# Altium footprint library HF_STM32F2_MCU.PcbLib: 59 footprints (part 4 of 6)
Each footprint in its own frame and in the unit in brackets; x right, y up, seen from the top. Pads: shape width x height; smd on the part's side, far side on the other; paste and mask are expansions set on the pad; w line width, h text height; cw(c..) or ccw(c..) is an arc to the next point about the centre after c.
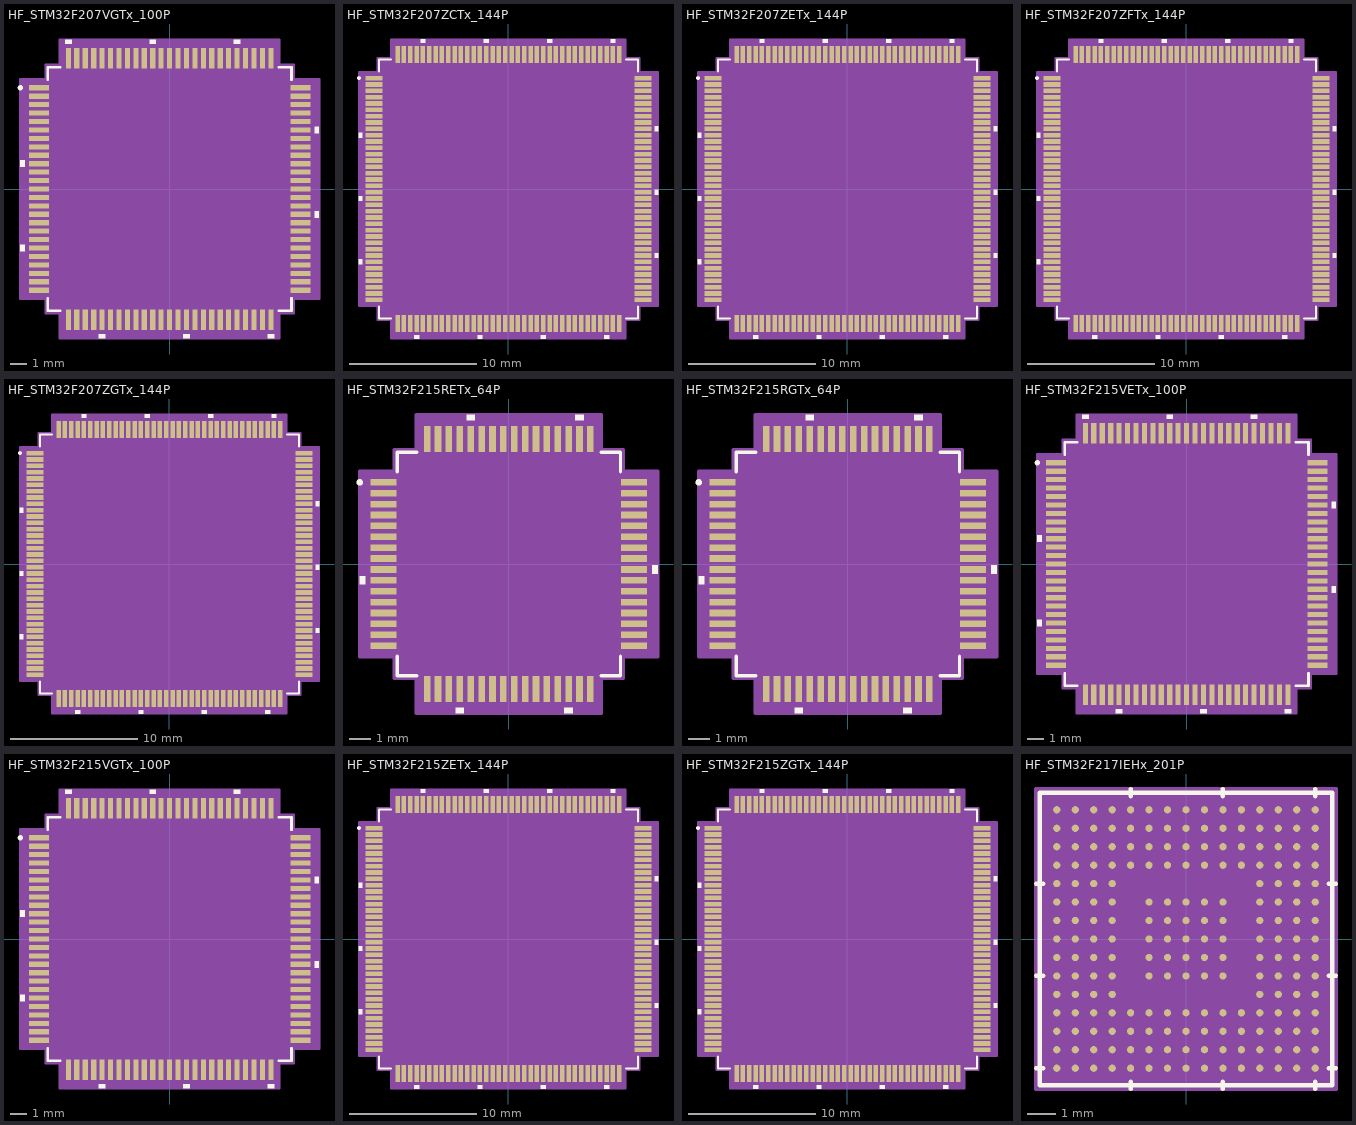
[diagram p3: the footprints below, top view; thin cyan lines are the x and y axes]

## HF_STM32F207VGTx_100P [mil] "LQFP100-14x14mm"
pads (100):
  rect 47x12 smd: 1(-305.12,236.22) 2(-305.12,216.54) 3(-305.12,196.85) 4(-305.12,177.17) 5(-305.12,157.48) 6(-305.12,137.8) 7(-305.12,118.11) 8(-305.12,98.43) 9(-305.12,78.74) 10(-305.12,59.06) 11(-305.12,39.37) 12(-305.12,19.69) 13(-305.12,0) 14(-305.12,-19.68) 15(-305.12,-39.37) 16(-305.12,-59.06) 17(-305.12,-78.74) 18(-305.12,-98.43) 19(-305.12,-118.11) 20(-305.12,-137.8) 21(-305.12,-157.48) 22(-305.12,-177.17) 23(-305.12,-196.85) 24(-305.12,-216.54) 25(-305.12,-236.22) 51(305.12,-236.22) 52(305.12,-216.54) 53(305.12,-196.85) 54(305.12,-177.17) 55(305.12,-157.48) 56(305.12,-137.8) 57(305.12,-118.11) 58(305.12,-98.43) 59(305.12,-78.74) 60(305.12,-59.06) 61(305.12,-39.37) 62(305.12,-19.68) 63(305.12,0) 64(305.12,19.68) 65(305.12,39.37) 66(305.12,59.06) 67(305.12,78.74) 68(305.12,98.43) 69(305.12,118.11) 70(305.12,137.8) 71(305.12,157.48) 72(305.12,177.17) 73(305.12,196.85) 74(305.12,216.54) 75(305.12,236.22)
  rect 12x47 smd: 26(-236.22,-305.12) 27(-216.54,-305.12) 28(-196.85,-305.12) 29(-177.17,-305.12) 30(-157.48,-305.12) 31(-137.8,-305.12) 32(-118.11,-305.12) 33(-98.43,-305.12) 34(-78.74,-305.12) 35(-59.06,-305.12) 36(-39.37,-305.12) 37(-19.68,-305.12) 38(0,-305.12) 39(19.68,-305.12) 40(39.37,-305.12) 41(59.06,-305.12) 42(78.74,-305.12) 43(98.43,-305.12) 44(118.11,-305.12) 45(137.8,-305.12) 46(157.48,-305.12) 47(177.17,-305.12) 48(196.85,-305.12) 49(216.54,-305.12) 50(236.22,-305.12) 76(236.22,305.12) 77(216.54,305.12) 78(196.85,305.12) 79(177.17,305.12) 80(157.48,305.12) 81(137.8,305.12) 82(118.11,305.12) 83(98.43,305.12) 84(78.74,305.12) 85(59.06,305.12) 86(39.37,305.12) 87(19.68,305.12) 88(0,305.12) 89(-19.68,305.12) 90(-39.37,305.12) 91(-59.06,305.12) 92(-78.74,305.12) 93(-98.43,305.12) 94(-118.11,305.12) 95(-137.8,305.12) 96(-157.48,305.12) 97(-177.17,305.12) 98(-196.85,305.12) 99(-216.54,305.12) 100(-236.22,305.12)
Top Overlay:
  circle w6: c-348.46,236.22 r3
  region: -338.62,66.56 -348.62,66.56 -348.62,51.56 -338.62,51.56
  region: -338.62,-130.3 -348.62,-130.3 -348.62,-145.3 -338.62,-145.3
  region: -149.98,-338.62 -164.98,-338.62 -164.98,-348.62 -149.98,-348.62
  region: 46.87,-338.62 31.87,-338.62 31.87,-348.62 46.87,-348.62
  region: 243.72,-338.62 228.72,-338.62 228.72,-348.62 243.72,-348.62
  region: 338.62,-51.56 348.62,-51.56 348.62,-66.56 338.62,-66.56
  region: 338.62,145.3 348.62,145.3 348.62,130.3 338.62,130.3
  region: 164.98,338.62 149.98,338.62 149.98,348.62 164.98,348.62
  region: -31.87,338.62 -46.87,338.62 -46.87,348.62 -31.87,348.62
  region: -228.72,338.62 -243.72,338.62 -243.72,348.62 -228.72,348.62
  lines w6: -284.5,-255.32 -284.5,-284.5 -255.32,-284.5 ; -284.5,255.32 -284.5,284.5 -255.32,284.5 ; 255.32,-284.5 284.5,-284.5 284.5,-255.32 ; 255.32,284.5 284.5,284.5 284.5,255.32
Mechanical 13:
  circle w0: c-256.62,236.22 r3
Mechanical 15:
  region: -256.22,-289.5 -289.5,-289.5 -289.5,-256.22 -348.62,-256.22 -348.62,256.22 -289.5,256.22 -289.5,289.5 -256.22,289.5 -256.22,348.62 256.22,348.62 256.22,289.5 289.5,289.5 289.5,256.22 348.62,256.22 348.62,-256.22 289.5,-256.22 289.5,-289.5 256.22,-289.5 256.22,-348.62 -256.22,-348.62
  lines w6: -348.62,-256.22 -289.5,-256.22 -289.5,-289.5 -256.22,-289.5 -256.22,-348.62 256.22,-348.62 256.22,-289.5 289.5,-289.5 289.5,-256.22 348.62,-256.22 348.62,256.22 289.5,256.22 289.5,289.5 256.22,289.5 256.22,348.62 -256.22,348.62 -256.22,289.5 -289.5,289.5 -289.5,256.22 -348.62,256.22 -348.62,-256.22
3D body "LQFP100-14x14mm.stp": height 63.1, standoff 0, extent -314.84,-314.84 314.84,314.84

## HF_STM32F207ZCTx_144P [mil] "LQFP144-20x20mm"
pads (144):
  rect 53x14 smd: 1(-418.31,344.49) 2(-418.31,324.8) 3(-418.31,305.12) 4(-418.31,285.43) 5(-418.31,265.75) 6(-418.31,246.06) 7(-418.31,226.38) 8(-418.31,206.69) 9(-418.31,187.01) 10(-418.31,167.32) 11(-418.31,147.64) 12(-418.31,127.95) 13(-418.31,108.27) 14(-418.31,88.58) 15(-418.31,68.9) 16(-418.31,49.21) 17(-418.31,29.53) 18(-418.31,9.84) 19(-418.31,-9.84) 20(-418.31,-29.53) 21(-418.31,-49.21) 22(-418.31,-68.9) 23(-418.31,-88.58) 24(-418.31,-108.27) 25(-418.31,-127.95) 26(-418.31,-147.64) 27(-418.31,-167.32) 28(-418.31,-187.01) 29(-418.31,-206.69) 30(-418.31,-226.38) 31(-418.31,-246.06) 32(-418.31,-265.75) 33(-418.31,-285.43) 34(-418.31,-305.12) 35(-418.31,-324.8) 36(-418.31,-344.49) 73(418.31,-344.49) 74(418.31,-324.8) 75(418.31,-305.12) 76(418.31,-285.43) 77(418.31,-265.75) 78(418.31,-246.06) 79(418.31,-226.38) 80(418.31,-206.69) 81(418.31,-187.01) 82(418.31,-167.32) 83(418.31,-147.64) 84(418.31,-127.95) 85(418.31,-108.27) 86(418.31,-88.58) 87(418.31,-68.9) 88(418.31,-49.21) 89(418.31,-29.53) 90(418.31,-9.84) 91(418.31,9.84) 92(418.31,29.53) 93(418.31,49.21) 94(418.31,68.9) 95(418.31,88.58) 96(418.31,108.27) 97(418.31,127.95) 98(418.31,147.64) 99(418.31,167.32) 100(418.31,187.01) 101(418.31,206.69) 102(418.31,226.38) 103(418.31,246.06) 104(418.31,265.75) 105(418.31,285.43) 106(418.31,305.12) 107(418.31,324.8) 108(418.31,344.49)
  rect 14x53 smd: 37(-344.49,-418.31) 38(-324.8,-418.31) 39(-305.12,-418.31) 40(-285.43,-418.31) 41(-265.75,-418.31) 42(-246.06,-418.31) 43(-226.38,-418.31) 44(-206.69,-418.31) 45(-187.01,-418.31) 46(-167.32,-418.31) 47(-147.64,-418.31) 48(-127.95,-418.31) 49(-108.27,-418.31) 50(-88.58,-418.31) 51(-68.9,-418.31) 52(-49.21,-418.31) 53(-29.53,-418.31) 54(-9.84,-418.31) 55(9.84,-418.31) 56(29.53,-418.31) 57(49.21,-418.31) 58(68.9,-418.31) 59(88.58,-418.31) 60(108.27,-418.31) 61(127.95,-418.31) 62(147.64,-418.31) 63(167.32,-418.31) 64(187.01,-418.31) 65(206.69,-418.31) 66(226.38,-418.31) 67(246.06,-418.31) 68(265.75,-418.31) 69(285.43,-418.31) 70(305.12,-418.31) 71(324.8,-418.31) 72(344.49,-418.31) 109(344.49,418.31) 110(324.8,418.31) 111(305.12,418.31) 112(285.43,418.31) 113(265.75,418.31) 114(246.06,418.31) 115(226.38,418.31) 116(206.69,418.31) 117(187.01,418.31) 118(167.32,418.31) 119(147.64,418.31) 120(127.95,418.31) 121(108.27,418.31) 122(88.58,418.31) 123(68.9,418.31) 124(49.21,418.31) 125(29.53,418.31) 126(9.84,418.31) 127(-9.84,418.31) 128(-29.53,418.31) 129(-49.21,418.31) 130(-68.9,418.31) 131(-88.58,418.31) 132(-108.27,418.31) 133(-127.95,418.31) 134(-147.64,418.31) 135(-167.32,418.31) 136(-187.01,418.31) 137(-206.69,418.31) 138(-226.38,418.31) 139(-246.06,418.31) 140(-265.75,418.31) 141(-285.43,418.31) 142(-305.12,418.31) 143(-324.8,418.31) 144(-344.49,418.31)
Top Overlay:
  circle w6: c-464.65,344.49 r3
  region: -454.81,174.82 -464.81,174.82 -464.81,159.82 -454.81,159.82
  region: -454.81,-22.03 -464.81,-22.03 -464.81,-37.03 -454.81,-37.03
  region: -454.81,-218.88 -464.81,-218.88 -464.81,-233.88 -454.81,-233.88
  region: -277.93,-454.81 -292.93,-454.81 -292.93,-464.81 -277.93,-464.81
  region: -81.08,-454.81 -96.08,-454.81 -96.08,-464.81 -81.08,-464.81
  region: 115.77,-454.81 100.77,-454.81 100.77,-464.81 115.77,-464.81
  region: 312.62,-454.81 297.62,-454.81 297.62,-464.81 312.62,-464.81
  region: 454.81,-199.19 464.81,-199.19 464.81,-214.19 454.81,-214.19
  region: 454.81,-2.34 464.81,-2.34 464.81,-17.34 454.81,-17.34
  region: 454.81,194.51 464.81,194.51 464.81,179.51 454.81,179.51
  region: 332.3,454.81 317.3,454.81 317.3,464.81 332.3,464.81
  region: 135.45,454.81 120.45,454.81 120.45,464.81 135.45,464.81
  region: -61.4,454.81 -76.4,454.81 -76.4,464.81 -61.4,464.81
  region: -258.25,454.81 -273.25,454.81 -273.25,464.81 -258.25,464.81
  lines w6: -402.5,-364.59 -402.5,-402.5 -364.59,-402.5 ; -402.5,364.59 -402.5,402.5 -364.59,402.5 ; 364.59,-402.5 402.5,-402.5 402.5,-364.59 ; 364.59,402.5 402.5,402.5 402.5,364.59
Mechanical 13:
  circle w0: c-366.81,344.49 r3
Mechanical 15:
  region: -364.49,-407.5 -407.5,-407.5 -407.5,-364.49 -464.81,-364.49 -464.81,364.49 -407.5,364.49 -407.5,407.5 -364.49,407.5 -364.49,464.81 364.49,464.81 364.49,407.5 407.5,407.5 407.5,364.49 464.81,364.49 464.81,-364.49 407.5,-364.49 407.5,-407.5 364.49,-407.5 364.49,-464.81 -364.49,-464.81
  lines w6: -464.81,-364.49 -407.5,-364.49 -407.5,-407.5 -364.49,-407.5 -364.49,-464.81 364.49,-464.81 364.49,-407.5 407.5,-407.5 407.5,-364.49 464.81,-364.49 464.81,364.49 407.5,364.49 407.5,407.5 364.49,407.5 364.49,464.81 -364.49,464.81 -364.49,407.5 -407.5,407.5 -407.5,364.49 -464.81,364.49 -464.81,-364.49
3D body "LQFP144-20x20mm.stp": height 63.1, standoff 0, extent -431.03,-431.03 431.03,431.03

## HF_STM32F207ZETx_144P [mil] "LQFP144-20x20mm"
pads (144):
  rect 53x14 smd: 1(-418.31,344.49) 2(-418.31,324.8) 3(-418.31,305.12) 4(-418.31,285.43) 5(-418.31,265.75) 6(-418.31,246.06) 7(-418.31,226.38) 8(-418.31,206.69) 9(-418.31,187.01) 10(-418.31,167.32) 11(-418.31,147.64) 12(-418.31,127.95) 13(-418.31,108.27) 14(-418.31,88.58) 15(-418.31,68.9) 16(-418.31,49.21) 17(-418.31,29.53) 18(-418.31,9.84) 19(-418.31,-9.84) 20(-418.31,-29.53) 21(-418.31,-49.21) 22(-418.31,-68.9) 23(-418.31,-88.58) 24(-418.31,-108.27) 25(-418.31,-127.95) 26(-418.31,-147.64) 27(-418.31,-167.32) 28(-418.31,-187.01) 29(-418.31,-206.69) 30(-418.31,-226.38) 31(-418.31,-246.06) 32(-418.31,-265.75) 33(-418.31,-285.43) 34(-418.31,-305.12) 35(-418.31,-324.8) 36(-418.31,-344.49) 73(418.31,-344.49) 74(418.31,-324.8) 75(418.31,-305.12) 76(418.31,-285.43) 77(418.31,-265.75) 78(418.31,-246.06) 79(418.31,-226.38) 80(418.31,-206.69) 81(418.31,-187.01) 82(418.31,-167.32) 83(418.31,-147.64) 84(418.31,-127.95) 85(418.31,-108.27) 86(418.31,-88.58) 87(418.31,-68.9) 88(418.31,-49.21) 89(418.31,-29.53) 90(418.31,-9.84) 91(418.31,9.84) 92(418.31,29.53) 93(418.31,49.21) 94(418.31,68.9) 95(418.31,88.58) 96(418.31,108.27) 97(418.31,127.95) 98(418.31,147.64) 99(418.31,167.32) 100(418.31,187.01) 101(418.31,206.69) 102(418.31,226.38) 103(418.31,246.06) 104(418.31,265.75) 105(418.31,285.43) 106(418.31,305.12) 107(418.31,324.8) 108(418.31,344.49)
  rect 14x53 smd: 37(-344.49,-418.31) 38(-324.8,-418.31) 39(-305.12,-418.31) 40(-285.43,-418.31) 41(-265.75,-418.31) 42(-246.06,-418.31) 43(-226.38,-418.31) 44(-206.69,-418.31) 45(-187.01,-418.31) 46(-167.32,-418.31) 47(-147.64,-418.31) 48(-127.95,-418.31) 49(-108.27,-418.31) 50(-88.58,-418.31) 51(-68.9,-418.31) 52(-49.21,-418.31) 53(-29.53,-418.31) 54(-9.84,-418.31) 55(9.84,-418.31) 56(29.53,-418.31) 57(49.21,-418.31) 58(68.9,-418.31) 59(88.58,-418.31) 60(108.27,-418.31) 61(127.95,-418.31) 62(147.64,-418.31) 63(167.32,-418.31) 64(187.01,-418.31) 65(206.69,-418.31) 66(226.38,-418.31) 67(246.06,-418.31) 68(265.75,-418.31) 69(285.43,-418.31) 70(305.12,-418.31) 71(324.8,-418.31) 72(344.49,-418.31) 109(344.49,418.31) 110(324.8,418.31) 111(305.12,418.31) 112(285.43,418.31) 113(265.75,418.31) 114(246.06,418.31) 115(226.38,418.31) 116(206.69,418.31) 117(187.01,418.31) 118(167.32,418.31) 119(147.64,418.31) 120(127.95,418.31) 121(108.27,418.31) 122(88.58,418.31) 123(68.9,418.31) 124(49.21,418.31) 125(29.53,418.31) 126(9.84,418.31) 127(-9.84,418.31) 128(-29.53,418.31) 129(-49.21,418.31) 130(-68.9,418.31) 131(-88.58,418.31) 132(-108.27,418.31) 133(-127.95,418.31) 134(-147.64,418.31) 135(-167.32,418.31) 136(-187.01,418.31) 137(-206.69,418.31) 138(-226.38,418.31) 139(-246.06,418.31) 140(-265.75,418.31) 141(-285.43,418.31) 142(-305.12,418.31) 143(-324.8,418.31) 144(-344.49,418.31)
Top Overlay:
  circle w6: c-464.65,344.49 r3
  region: -454.81,174.82 -464.81,174.82 -464.81,159.82 -454.81,159.82
  region: -454.81,-22.03 -464.81,-22.03 -464.81,-37.03 -454.81,-37.03
  region: -454.81,-218.88 -464.81,-218.88 -464.81,-233.88 -454.81,-233.88
  region: -277.93,-454.81 -292.93,-454.81 -292.93,-464.81 -277.93,-464.81
  region: -81.08,-454.81 -96.08,-454.81 -96.08,-464.81 -81.08,-464.81
  region: 115.77,-454.81 100.77,-454.81 100.77,-464.81 115.77,-464.81
  region: 312.62,-454.81 297.62,-454.81 297.62,-464.81 312.62,-464.81
  region: 454.81,-199.19 464.81,-199.19 464.81,-214.19 454.81,-214.19
  region: 454.81,-2.34 464.81,-2.34 464.81,-17.34 454.81,-17.34
  region: 454.81,194.51 464.81,194.51 464.81,179.51 454.81,179.51
  region: 332.3,454.81 317.3,454.81 317.3,464.81 332.3,464.81
  region: 135.45,454.81 120.45,454.81 120.45,464.81 135.45,464.81
  region: -61.4,454.81 -76.4,454.81 -76.4,464.81 -61.4,464.81
  region: -258.25,454.81 -273.25,454.81 -273.25,464.81 -258.25,464.81
  lines w6: -402.5,-364.59 -402.5,-402.5 -364.59,-402.5 ; -402.5,364.59 -402.5,402.5 -364.59,402.5 ; 364.59,-402.5 402.5,-402.5 402.5,-364.59 ; 364.59,402.5 402.5,402.5 402.5,364.59
Mechanical 13:
  circle w0: c-366.81,344.49 r3
Mechanical 15:
  region: -364.49,-407.5 -407.5,-407.5 -407.5,-364.49 -464.81,-364.49 -464.81,364.49 -407.5,364.49 -407.5,407.5 -364.49,407.5 -364.49,464.81 364.49,464.81 364.49,407.5 407.5,407.5 407.5,364.49 464.81,364.49 464.81,-364.49 407.5,-364.49 407.5,-407.5 364.49,-407.5 364.49,-464.81 -364.49,-464.81
  lines w6: -464.81,-364.49 -407.5,-364.49 -407.5,-407.5 -364.49,-407.5 -364.49,-464.81 364.49,-464.81 364.49,-407.5 407.5,-407.5 407.5,-364.49 464.81,-364.49 464.81,364.49 407.5,364.49 407.5,407.5 364.49,407.5 364.49,464.81 -364.49,464.81 -364.49,407.5 -407.5,407.5 -407.5,364.49 -464.81,364.49 -464.81,-364.49
3D body "LQFP144-20x20mm.stp": height 63.1, standoff 0, extent -431.03,-431.03 431.03,431.03

## HF_STM32F207ZFTx_144P [mil] "LQFP144-20x20mm"
pads (144):
  rect 53x14 smd: 1(-418.31,344.49) 2(-418.31,324.8) 3(-418.31,305.12) 4(-418.31,285.43) 5(-418.31,265.75) 6(-418.31,246.06) 7(-418.31,226.38) 8(-418.31,206.69) 9(-418.31,187.01) 10(-418.31,167.32) 11(-418.31,147.64) 12(-418.31,127.95) 13(-418.31,108.27) 14(-418.31,88.58) 15(-418.31,68.9) 16(-418.31,49.21) 17(-418.31,29.53) 18(-418.31,9.84) 19(-418.31,-9.84) 20(-418.31,-29.53) 21(-418.31,-49.21) 22(-418.31,-68.9) 23(-418.31,-88.58) 24(-418.31,-108.27) 25(-418.31,-127.95) 26(-418.31,-147.64) 27(-418.31,-167.32) 28(-418.31,-187.01) 29(-418.31,-206.69) 30(-418.31,-226.38) 31(-418.31,-246.06) 32(-418.31,-265.75) 33(-418.31,-285.43) 34(-418.31,-305.12) 35(-418.31,-324.8) 36(-418.31,-344.49) 73(418.31,-344.49) 74(418.31,-324.8) 75(418.31,-305.12) 76(418.31,-285.43) 77(418.31,-265.75) 78(418.31,-246.06) 79(418.31,-226.38) 80(418.31,-206.69) 81(418.31,-187.01) 82(418.31,-167.32) 83(418.31,-147.64) 84(418.31,-127.95) 85(418.31,-108.27) 86(418.31,-88.58) 87(418.31,-68.9) 88(418.31,-49.21) 89(418.31,-29.53) 90(418.31,-9.84) 91(418.31,9.84) 92(418.31,29.53) 93(418.31,49.21) 94(418.31,68.9) 95(418.31,88.58) 96(418.31,108.27) 97(418.31,127.95) 98(418.31,147.64) 99(418.31,167.32) 100(418.31,187.01) 101(418.31,206.69) 102(418.31,226.38) 103(418.31,246.06) 104(418.31,265.75) 105(418.31,285.43) 106(418.31,305.12) 107(418.31,324.8) 108(418.31,344.49)
  rect 14x53 smd: 37(-344.49,-418.31) 38(-324.8,-418.31) 39(-305.12,-418.31) 40(-285.43,-418.31) 41(-265.75,-418.31) 42(-246.06,-418.31) 43(-226.38,-418.31) 44(-206.69,-418.31) 45(-187.01,-418.31) 46(-167.32,-418.31) 47(-147.64,-418.31) 48(-127.95,-418.31) 49(-108.27,-418.31) 50(-88.58,-418.31) 51(-68.9,-418.31) 52(-49.21,-418.31) 53(-29.53,-418.31) 54(-9.84,-418.31) 55(9.84,-418.31) 56(29.53,-418.31) 57(49.21,-418.31) 58(68.9,-418.31) 59(88.58,-418.31) 60(108.27,-418.31) 61(127.95,-418.31) 62(147.64,-418.31) 63(167.32,-418.31) 64(187.01,-418.31) 65(206.69,-418.31) 66(226.38,-418.31) 67(246.06,-418.31) 68(265.75,-418.31) 69(285.43,-418.31) 70(305.12,-418.31) 71(324.8,-418.31) 72(344.49,-418.31) 109(344.49,418.31) 110(324.8,418.31) 111(305.12,418.31) 112(285.43,418.31) 113(265.75,418.31) 114(246.06,418.31) 115(226.38,418.31) 116(206.69,418.31) 117(187.01,418.31) 118(167.32,418.31) 119(147.64,418.31) 120(127.95,418.31) 121(108.27,418.31) 122(88.58,418.31) 123(68.9,418.31) 124(49.21,418.31) 125(29.53,418.31) 126(9.84,418.31) 127(-9.84,418.31) 128(-29.53,418.31) 129(-49.21,418.31) 130(-68.9,418.31) 131(-88.58,418.31) 132(-108.27,418.31) 133(-127.95,418.31) 134(-147.64,418.31) 135(-167.32,418.31) 136(-187.01,418.31) 137(-206.69,418.31) 138(-226.38,418.31) 139(-246.06,418.31) 140(-265.75,418.31) 141(-285.43,418.31) 142(-305.12,418.31) 143(-324.8,418.31) 144(-344.49,418.31)
Top Overlay:
  circle w6: c-464.65,344.49 r3
  region: -454.81,174.82 -464.81,174.82 -464.81,159.82 -454.81,159.82
  region: -454.81,-22.03 -464.81,-22.03 -464.81,-37.03 -454.81,-37.03
  region: -454.81,-218.88 -464.81,-218.88 -464.81,-233.88 -454.81,-233.88
  region: -277.93,-454.81 -292.93,-454.81 -292.93,-464.81 -277.93,-464.81
  region: -81.08,-454.81 -96.08,-454.81 -96.08,-464.81 -81.08,-464.81
  region: 115.77,-454.81 100.77,-454.81 100.77,-464.81 115.77,-464.81
  region: 312.62,-454.81 297.62,-454.81 297.62,-464.81 312.62,-464.81
  region: 454.81,-199.19 464.81,-199.19 464.81,-214.19 454.81,-214.19
  region: 454.81,-2.34 464.81,-2.34 464.81,-17.34 454.81,-17.34
  region: 454.81,194.51 464.81,194.51 464.81,179.51 454.81,179.51
  region: 332.3,454.81 317.3,454.81 317.3,464.81 332.3,464.81
  region: 135.45,454.81 120.45,454.81 120.45,464.81 135.45,464.81
  region: -61.4,454.81 -76.4,454.81 -76.4,464.81 -61.4,464.81
  region: -258.25,454.81 -273.25,454.81 -273.25,464.81 -258.25,464.81
  lines w6: -402.5,-364.59 -402.5,-402.5 -364.59,-402.5 ; -402.5,364.59 -402.5,402.5 -364.59,402.5 ; 364.59,-402.5 402.5,-402.5 402.5,-364.59 ; 364.59,402.5 402.5,402.5 402.5,364.59
Mechanical 13:
  circle w0: c-366.81,344.49 r3
Mechanical 15:
  region: -364.49,-407.5 -407.5,-407.5 -407.5,-364.49 -464.81,-364.49 -464.81,364.49 -407.5,364.49 -407.5,407.5 -364.49,407.5 -364.49,464.81 364.49,464.81 364.49,407.5 407.5,407.5 407.5,364.49 464.81,364.49 464.81,-364.49 407.5,-364.49 407.5,-407.5 364.49,-407.5 364.49,-464.81 -364.49,-464.81
  lines w6: -464.81,-364.49 -407.5,-364.49 -407.5,-407.5 -364.49,-407.5 -364.49,-464.81 364.49,-464.81 364.49,-407.5 407.5,-407.5 407.5,-364.49 464.81,-364.49 464.81,364.49 407.5,364.49 407.5,407.5 364.49,407.5 364.49,464.81 -364.49,464.81 -364.49,407.5 -407.5,407.5 -407.5,364.49 -464.81,364.49 -464.81,-364.49
3D body "LQFP144-20x20mm.stp": height 63.1, standoff 0, extent -431.03,-431.03 431.03,431.03

## HF_STM32F207ZGTx_144P [mil] "LQFP144-20x20mm"
pads (144):
  rect 53x14 smd: 1(-418.31,344.49) 2(-418.31,324.8) 3(-418.31,305.12) 4(-418.31,285.43) 5(-418.31,265.75) 6(-418.31,246.06) 7(-418.31,226.38) 8(-418.31,206.69) 9(-418.31,187.01) 10(-418.31,167.32) 11(-418.31,147.64) 12(-418.31,127.95) 13(-418.31,108.27) 14(-418.31,88.58) 15(-418.31,68.9) 16(-418.31,49.21) 17(-418.31,29.53) 18(-418.31,9.84) 19(-418.31,-9.84) 20(-418.31,-29.53) 21(-418.31,-49.21) 22(-418.31,-68.9) 23(-418.31,-88.58) 24(-418.31,-108.27) 25(-418.31,-127.95) 26(-418.31,-147.64) 27(-418.31,-167.32) 28(-418.31,-187.01) 29(-418.31,-206.69) 30(-418.31,-226.38) 31(-418.31,-246.06) 32(-418.31,-265.75) 33(-418.31,-285.43) 34(-418.31,-305.12) 35(-418.31,-324.8) 36(-418.31,-344.49) 73(418.31,-344.49) 74(418.31,-324.8) 75(418.31,-305.12) 76(418.31,-285.43) 77(418.31,-265.75) 78(418.31,-246.06) 79(418.31,-226.38) 80(418.31,-206.69) 81(418.31,-187.01) 82(418.31,-167.32) 83(418.31,-147.64) 84(418.31,-127.95) 85(418.31,-108.27) 86(418.31,-88.58) 87(418.31,-68.9) 88(418.31,-49.21) 89(418.31,-29.53) 90(418.31,-9.84) 91(418.31,9.84) 92(418.31,29.53) 93(418.31,49.21) 94(418.31,68.9) 95(418.31,88.58) 96(418.31,108.27) 97(418.31,127.95) 98(418.31,147.64) 99(418.31,167.32) 100(418.31,187.01) 101(418.31,206.69) 102(418.31,226.38) 103(418.31,246.06) 104(418.31,265.75) 105(418.31,285.43) 106(418.31,305.12) 107(418.31,324.8) 108(418.31,344.49)
  rect 14x53 smd: 37(-344.49,-418.31) 38(-324.8,-418.31) 39(-305.12,-418.31) 40(-285.43,-418.31) 41(-265.75,-418.31) 42(-246.06,-418.31) 43(-226.38,-418.31) 44(-206.69,-418.31) 45(-187.01,-418.31) 46(-167.32,-418.31) 47(-147.64,-418.31) 48(-127.95,-418.31) 49(-108.27,-418.31) 50(-88.58,-418.31) 51(-68.9,-418.31) 52(-49.21,-418.31) 53(-29.53,-418.31) 54(-9.84,-418.31) 55(9.84,-418.31) 56(29.53,-418.31) 57(49.21,-418.31) 58(68.9,-418.31) 59(88.58,-418.31) 60(108.27,-418.31) 61(127.95,-418.31) 62(147.64,-418.31) 63(167.32,-418.31) 64(187.01,-418.31) 65(206.69,-418.31) 66(226.38,-418.31) 67(246.06,-418.31) 68(265.75,-418.31) 69(285.43,-418.31) 70(305.12,-418.31) 71(324.8,-418.31) 72(344.49,-418.31) 109(344.49,418.31) 110(324.8,418.31) 111(305.12,418.31) 112(285.43,418.31) 113(265.75,418.31) 114(246.06,418.31) 115(226.38,418.31) 116(206.69,418.31) 117(187.01,418.31) 118(167.32,418.31) 119(147.64,418.31) 120(127.95,418.31) 121(108.27,418.31) 122(88.58,418.31) 123(68.9,418.31) 124(49.21,418.31) 125(29.53,418.31) 126(9.84,418.31) 127(-9.84,418.31) 128(-29.53,418.31) 129(-49.21,418.31) 130(-68.9,418.31) 131(-88.58,418.31) 132(-108.27,418.31) 133(-127.95,418.31) 134(-147.64,418.31) 135(-167.32,418.31) 136(-187.01,418.31) 137(-206.69,418.31) 138(-226.38,418.31) 139(-246.06,418.31) 140(-265.75,418.31) 141(-285.43,418.31) 142(-305.12,418.31) 143(-324.8,418.31) 144(-344.49,418.31)
Top Overlay:
  circle w6: c-464.65,344.49 r3
  region: -454.81,174.82 -464.81,174.82 -464.81,159.82 -454.81,159.82
  region: -454.81,-22.03 -464.81,-22.03 -464.81,-37.03 -454.81,-37.03
  region: -454.81,-218.88 -464.81,-218.88 -464.81,-233.88 -454.81,-233.88
  region: -277.93,-454.81 -292.93,-454.81 -292.93,-464.81 -277.93,-464.81
  region: -81.08,-454.81 -96.08,-454.81 -96.08,-464.81 -81.08,-464.81
  region: 115.77,-454.81 100.77,-454.81 100.77,-464.81 115.77,-464.81
  region: 312.62,-454.81 297.62,-454.81 297.62,-464.81 312.62,-464.81
  region: 454.81,-199.19 464.81,-199.19 464.81,-214.19 454.81,-214.19
  region: 454.81,-2.34 464.81,-2.34 464.81,-17.34 454.81,-17.34
  region: 454.81,194.51 464.81,194.51 464.81,179.51 454.81,179.51
  region: 332.3,454.81 317.3,454.81 317.3,464.81 332.3,464.81
  region: 135.45,454.81 120.45,454.81 120.45,464.81 135.45,464.81
  region: -61.4,454.81 -76.4,454.81 -76.4,464.81 -61.4,464.81
  region: -258.25,454.81 -273.25,454.81 -273.25,464.81 -258.25,464.81
  lines w6: -402.5,-364.59 -402.5,-402.5 -364.59,-402.5 ; -402.5,364.59 -402.5,402.5 -364.59,402.5 ; 364.59,-402.5 402.5,-402.5 402.5,-364.59 ; 364.59,402.5 402.5,402.5 402.5,364.59
Mechanical 13:
  circle w0: c-366.81,344.49 r3
Mechanical 15:
  region: -364.49,-407.5 -407.5,-407.5 -407.5,-364.49 -464.81,-364.49 -464.81,364.49 -407.5,364.49 -407.5,407.5 -364.49,407.5 -364.49,464.81 364.49,464.81 364.49,407.5 407.5,407.5 407.5,364.49 464.81,364.49 464.81,-364.49 407.5,-364.49 407.5,-407.5 364.49,-407.5 364.49,-464.81 -364.49,-464.81
  lines w6: -464.81,-364.49 -407.5,-364.49 -407.5,-407.5 -364.49,-407.5 -364.49,-464.81 364.49,-464.81 364.49,-407.5 407.5,-407.5 407.5,-364.49 464.81,-364.49 464.81,364.49 407.5,364.49 407.5,407.5 364.49,407.5 364.49,464.81 -364.49,464.81 -364.49,407.5 -407.5,407.5 -407.5,364.49 -464.81,364.49 -464.81,-364.49